# Altium schematic symbol library MCU_ST_STM32F4.SchLib: 211 symbols (part 4 of 10)
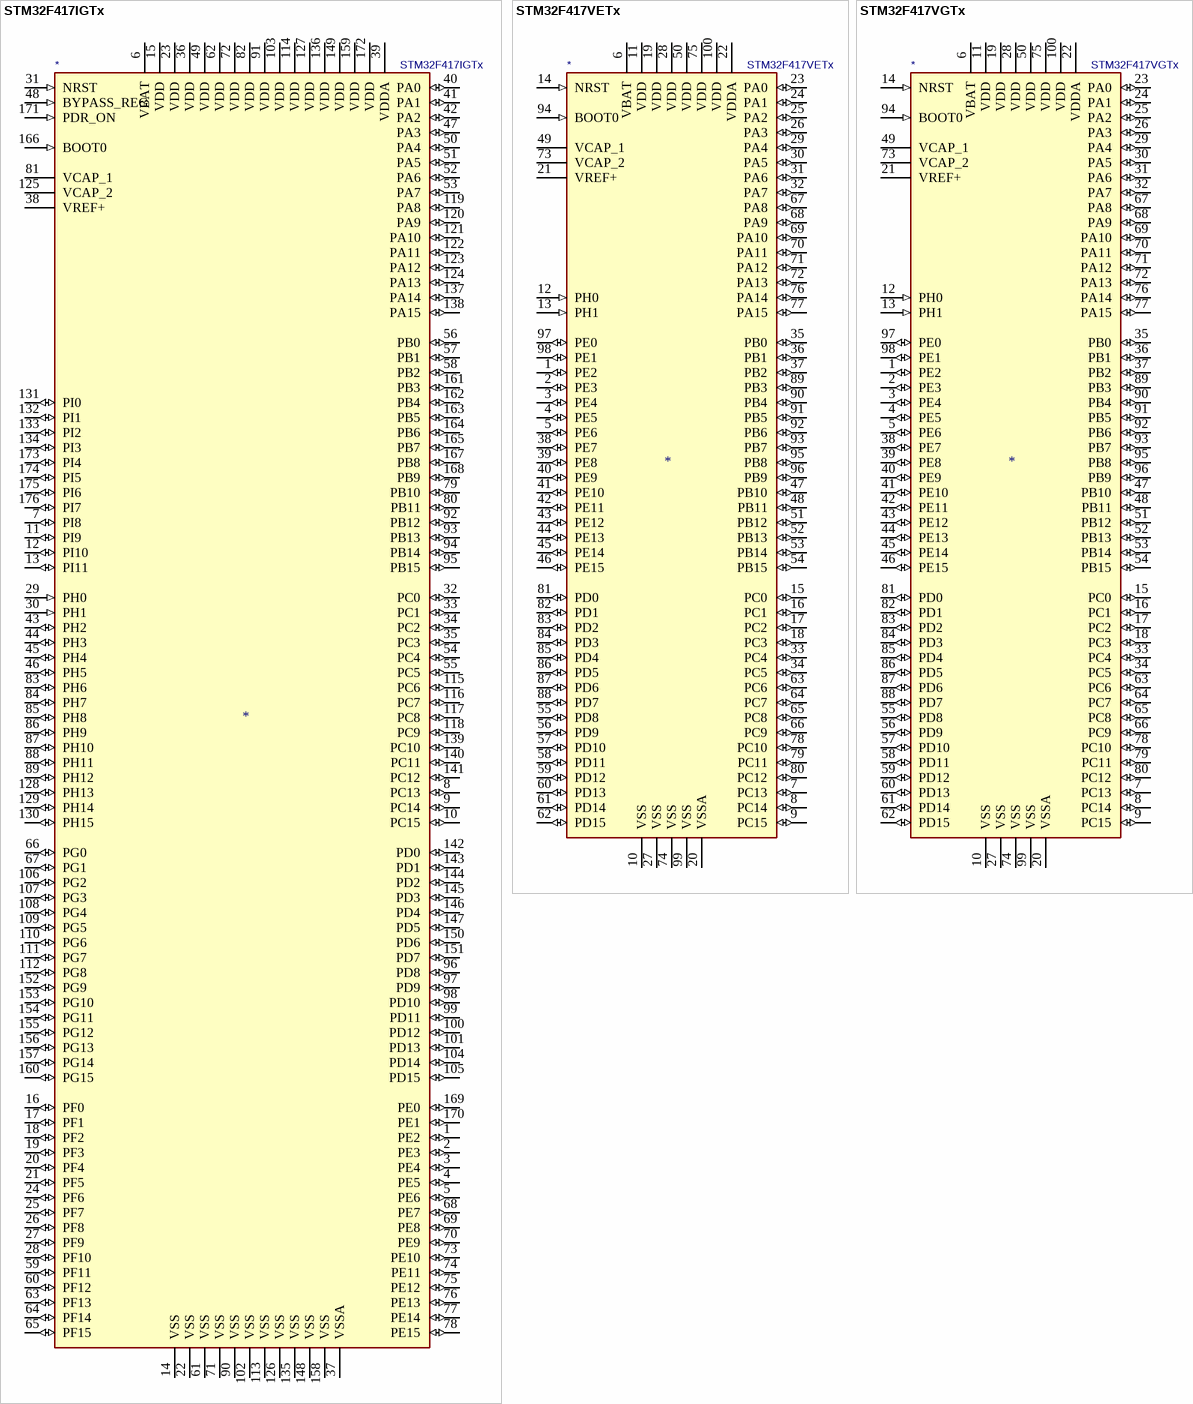
[diagram p65: symbols STM32F417IGTx to STM32F417VGTx]

## STM32F417VGTx
designator *  value STM32F417VGTx
ki_keywords: ARM Cortex-M4 STM32F4 STM32F407/417; ki_description: ARM Cortex-M4 MCU, 1024KB flash, 128KB RAM, 168MHz, 1.8-3.6V, 82 GPIO, LQFP-100; ki_fp_filters: LQFP*14x14mm*P0.5mm*; Footprint: Package_QFP:LQFP-100_14x14mm_P0.5mm; Supplier: http://www.st.com/st-web-ui/static/active/en/resource/technical/document/datasheet/DM00035129.pdf
footprint LQFP-100_14x14mm_P0.5mm
pins: 1 PE2 (io), 2 PE3 (io), 3 PE4 (io), 4 PE5 (io), 5 PE6 (io), 6 VBAT (power), 7 PC13 (io), 8 PC14 (io), 9 PC15 (io), 10 VSS (power), 11 VDD (power), 12 PH0 (in), 13 PH1 (in), 14 NRST (in), 15 PC0 (io), 16 PC1 (io), 17 PC2 (io), 18 PC3 (io), 19 VDD (power), 20 VSSA (power), 21 VREF+ (power), 22 VDDA (power), 23 PA0 (io), 24 PA1 (io), 25 PA2 (io), 26 PA3 (io), 27 VSS (power), 28 VDD (power), 29 PA4 (io), 30 PA5 (io), 31 PA6 (io), 32 PA7 (io), 33 PC4 (io), 34 PC5 (io), 35 PB0 (io), 36 PB1 (io), 37 PB2 (io), 38 PE7 (io), 39 PE8 (io), 40 PE9 (io), 41 PE10 (io), 42 PE11 (io), 43 PE12 (io), 44 PE13 (io), 45 PE14 (io), 46 PE15 (io), 47 PB10 (io), 48 PB11 (io), 49 VCAP_1 (power), 50 VDD (power), 51 PB12 (io), 52 PB13 (io), 53 PB14 (io), 54 PB15 (io), 55 PD8 (io), 56 PD9 (io), 57 PD10 (io), 58 PD11 (io), 59 PD12 (io), 60 PD13 (io), 61 PD14 (io), 62 PD15 (io), 63 PC6 (io), 64 PC7 (io), 65 PC8 (io), 66 PC9 (io), 67 PA8 (io), 68 PA9 (io), 69 PA10 (io), 70 PA11 (io), 71 PA12 (io), 72 PA13 (io), 73 VCAP_2 (power), 74 VSS (power), 75 VDD (power), 76 PA14 (io), 77 PA15 (io), 78 PC10 (io), 79 PC11 (io), 80 PC12 (io), 81 PD0 (io), 82 PD1 (io), 83 PD2 (io), 84 PD3 (io), 85 PD4 (io), 86 PD5 (io), 87 PD6 (io), 88 PD7 (io), 89 PB3 (io), 90 PB4 (io), 91 PB5 (io), 92 PB6 (io), 93 PB7 (io), 94 BOOT0 (in), 95 PB8 (io), 96 PB9 (io), 97 PE0 (io), 98 PE1 (io), 99 VSS (power), 100 VDD (power)

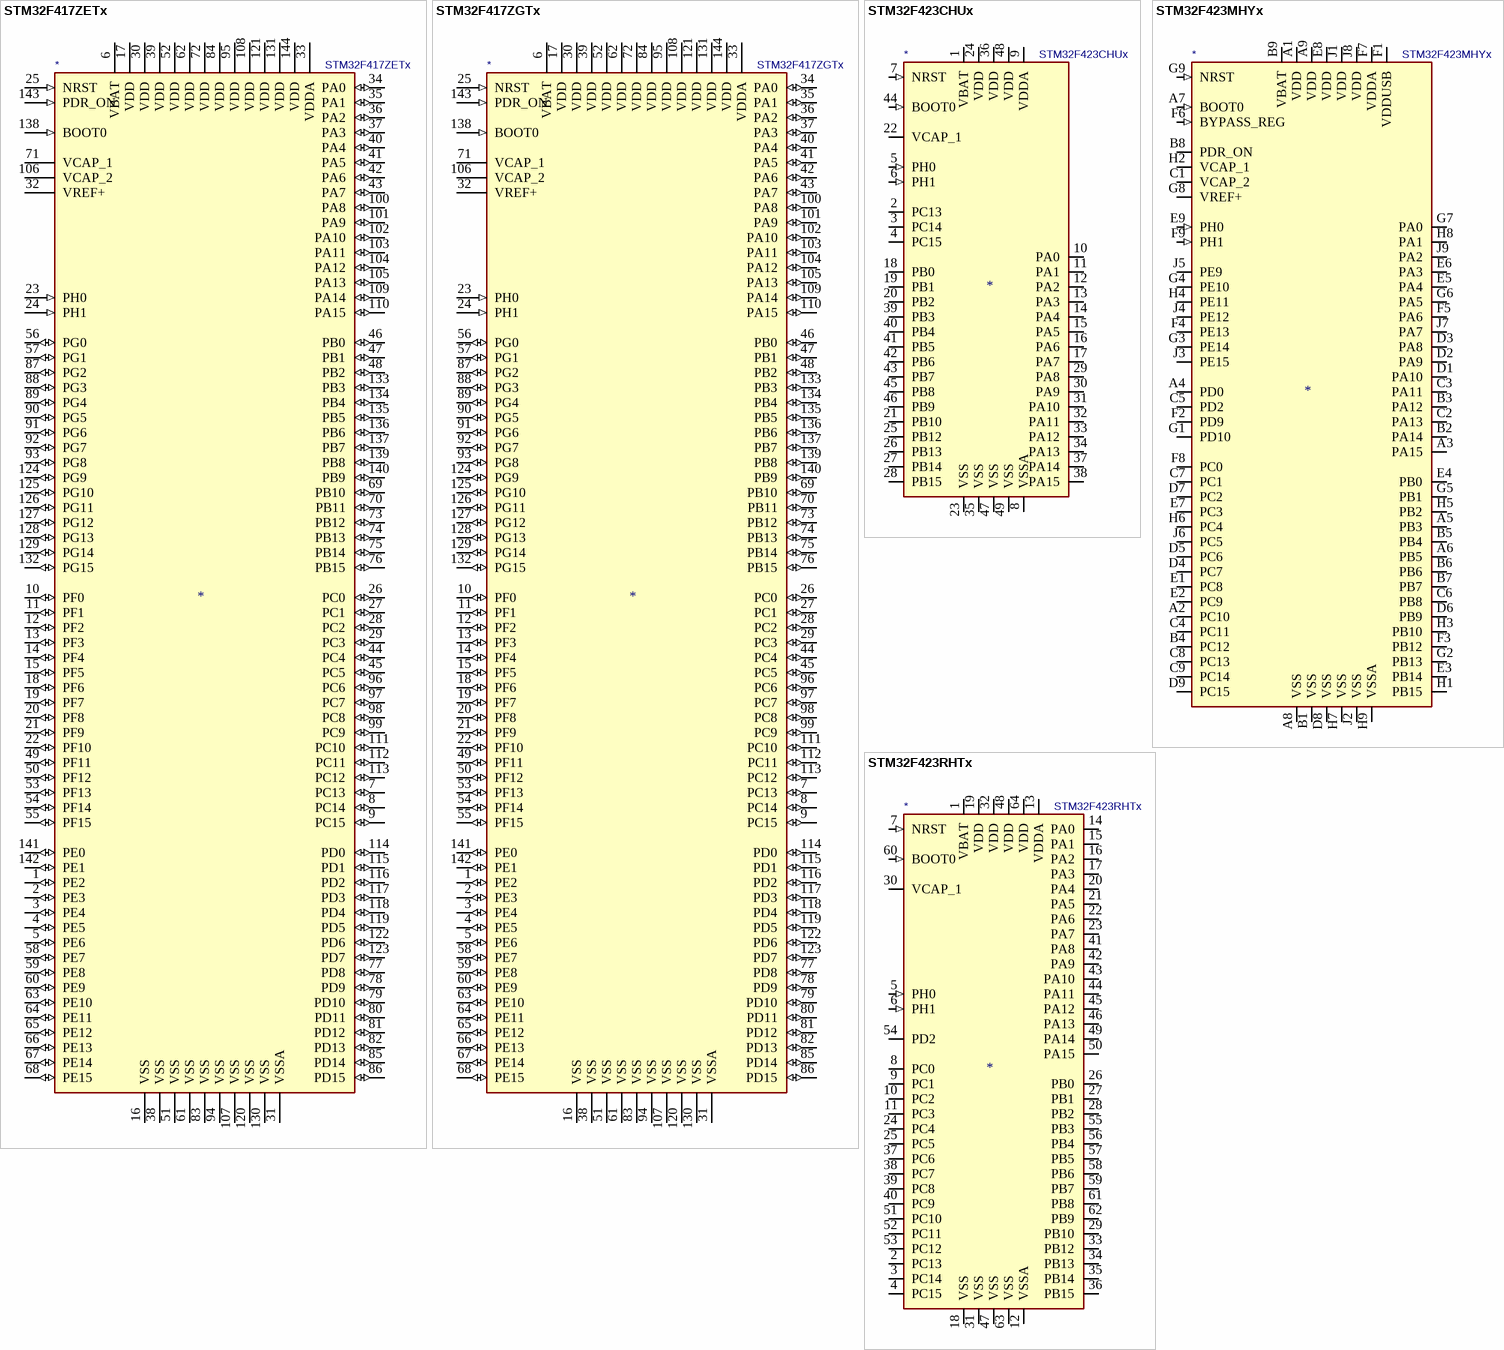
[diagram p20: symbols STM32F417ZETx to STM32F423RHTx]

## STM32F417ZETx
designator *  value STM32F417ZETx
ki_keywords: ARM Cortex-M4 STM32F4 STM32F407/417; ki_description: ARM Cortex-M4 MCU, 512KB flash, 128KB RAM, 168MHz, 1.8-3.6V, 114 GPIO, LQFP-144; ki_fp_filters: LQFP*20x20mm*P0.5mm*; Footprint: Package_QFP:LQFP-144_20x20mm_P0.5mm; Supplier: http://www.st.com/st-web-ui/static/active/en/resource/technical/document/datasheet/DM00035129.pdf
footprint LQFP-144_20x20mm_P0.5mm
pins: 1 PE2 (io), 2 PE3 (io), 3 PE4 (io), 4 PE5 (io), 5 PE6 (io), 6 VBAT (power), 7 PC13 (io), 8 PC14 (io), 9 PC15 (io), 10 PF0 (io), 11 PF1 (io), 12 PF2 (io), 13 PF3 (io), 14 PF4 (io), 15 PF5 (io), 16 VSS (power), 17 VDD (power), 18 PF6 (io), 19 PF7 (io), 20 PF8 (io), 21 PF9 (io), 22 PF10 (io), 23 PH0 (in), 24 PH1 (in), 25 NRST (in), 26 PC0 (io), 27 PC1 (io), 28 PC2 (io), 29 PC3 (io), 30 VDD (power), 31 VSSA (power), 32 VREF+ (power), 33 VDDA (power), 34 PA0 (io), 35 PA1 (io), 36 PA2 (io), 37 PA3 (io), 38 VSS (power), 39 VDD (power), 40 PA4 (io), 41 PA5 (io), 42 PA6 (io), 43 PA7 (io), 44 PC4 (io), 45 PC5 (io), 46 PB0 (io), 47 PB1 (io), 48 PB2 (io), 49 PF11 (io), 50 PF12 (io), 51 VSS (power), 52 VDD (power), 53 PF13 (io), 54 PF14 (io), 55 PF15 (io), 56 PG0 (io), 57 PG1 (io), 58 PE7 (io), 59 PE8 (io), 60 PE9 (io), 61 VSS (power), 62 VDD (power), 63 PE10 (io), 64 PE11 (io), 65 PE12 (io), 66 PE13 (io), 67 PE14 (io), 68 PE15 (io), 69 PB10 (io), 70 PB11 (io), 71 VCAP_1 (power), 72 VDD (power), 73 PB12 (io), 74 PB13 (io), 75 PB14 (io), 76 PB15 (io), 77 PD8 (io), 78 PD9 (io), 79 PD10 (io), 80 PD11 (io), 81 PD12 (io), 82 PD13 (io), 83 VSS (power), 84 VDD (power), 85 PD14 (io), 86 PD15 (io), 87 PG2 (io), 88 PG3 (io), 89 PG4 (io), 90 PG5 (io), 91 PG6 (io), 92 PG7 (io), 93 PG8 (io), 94 VSS (power), 95 VDD (power), 96 PC6 (io), 97 PC7 (io), 98 PC8 (io), 99 PC9 (io), 100 PA8 (io), 101 PA9 (io), 102 PA10 (io), 103 PA11 (io), 104 PA12 (io), 105 PA13 (io), 106 VCAP_2 (power), 107 VSS (power), 108 VDD (power), 109 PA14 (io), 110 PA15 (io), 111 PC10 (io), 112 PC11 (io), 113 PC12 (io), 114 PD0 (io), 115 PD1 (io), 116 PD2 (io), 117 PD3 (io), 118 PD4 (io), 119 PD5 (io), 120 VSS (power), 121 VDD (power), 122 PD6 (io), 123 PD7 (io), 124 PG9 (io), 125 PG10 (io), 126 PG11 (io), 127 PG12 (io), 128 PG13 (io), 129 PG14 (io), 130 VSS (power), 131 VDD (power), 132 PG15 (io), 133 PB3 (io), 134 PB4 (io), 135 PB5 (io), 136 PB6 (io), 137 PB7 (io), 138 BOOT0 (in), 139 PB8 (io), 140 PB9 (io), 141 PE0 (io), 142 PE1 (io), 143 PDR_ON (in), 144 VDD (power)

## STM32F417ZGTx
designator *  value STM32F417ZGTx
ki_keywords: ARM Cortex-M4 STM32F4 STM32F407/417; ki_description: ARM Cortex-M4 MCU, 1024KB flash, 128KB RAM, 168MHz, 1.8-3.6V, 114 GPIO, LQFP-144; ki_fp_filters: LQFP*20x20mm*P0.5mm*; Footprint: Package_QFP:LQFP-144_20x20mm_P0.5mm; Supplier: http://www.st.com/st-web-ui/static/active/en/resource/technical/document/datasheet/DM00035129.pdf
footprint LQFP-144_20x20mm_P0.5mm
pins: 1 PE2 (io), 2 PE3 (io), 3 PE4 (io), 4 PE5 (io), 5 PE6 (io), 6 VBAT (power), 7 PC13 (io), 8 PC14 (io), 9 PC15 (io), 10 PF0 (io), 11 PF1 (io), 12 PF2 (io), 13 PF3 (io), 14 PF4 (io), 15 PF5 (io), 16 VSS (power), 17 VDD (power), 18 PF6 (io), 19 PF7 (io), 20 PF8 (io), 21 PF9 (io), 22 PF10 (io), 23 PH0 (in), 24 PH1 (in), 25 NRST (in), 26 PC0 (io), 27 PC1 (io), 28 PC2 (io), 29 PC3 (io), 30 VDD (power), 31 VSSA (power), 32 VREF+ (power), 33 VDDA (power), 34 PA0 (io), 35 PA1 (io), 36 PA2 (io), 37 PA3 (io), 38 VSS (power), 39 VDD (power), 40 PA4 (io), 41 PA5 (io), 42 PA6 (io), 43 PA7 (io), 44 PC4 (io), 45 PC5 (io), 46 PB0 (io), 47 PB1 (io), 48 PB2 (io), 49 PF11 (io), 50 PF12 (io), 51 VSS (power), 52 VDD (power), 53 PF13 (io), 54 PF14 (io), 55 PF15 (io), 56 PG0 (io), 57 PG1 (io), 58 PE7 (io), 59 PE8 (io), 60 PE9 (io), 61 VSS (power), 62 VDD (power), 63 PE10 (io), 64 PE11 (io), 65 PE12 (io), 66 PE13 (io), 67 PE14 (io), 68 PE15 (io), 69 PB10 (io), 70 PB11 (io), 71 VCAP_1 (power), 72 VDD (power), 73 PB12 (io), 74 PB13 (io), 75 PB14 (io), 76 PB15 (io), 77 PD8 (io), 78 PD9 (io), 79 PD10 (io), 80 PD11 (io), 81 PD12 (io), 82 PD13 (io), 83 VSS (power), 84 VDD (power), 85 PD14 (io), 86 PD15 (io), 87 PG2 (io), 88 PG3 (io), 89 PG4 (io), 90 PG5 (io), 91 PG6 (io), 92 PG7 (io), 93 PG8 (io), 94 VSS (power), 95 VDD (power), 96 PC6 (io), 97 PC7 (io), 98 PC8 (io), 99 PC9 (io), 100 PA8 (io), 101 PA9 (io), 102 PA10 (io), 103 PA11 (io), 104 PA12 (io), 105 PA13 (io), 106 VCAP_2 (power), 107 VSS (power), 108 VDD (power), 109 PA14 (io), 110 PA15 (io), 111 PC10 (io), 112 PC11 (io), 113 PC12 (io), 114 PD0 (io), 115 PD1 (io), 116 PD2 (io), 117 PD3 (io), 118 PD4 (io), 119 PD5 (io), 120 VSS (power), 121 VDD (power), 122 PD6 (io), 123 PD7 (io), 124 PG9 (io), 125 PG10 (io), 126 PG11 (io), 127 PG12 (io), 128 PG13 (io), 129 PG14 (io), 130 VSS (power), 131 VDD (power), 132 PG15 (io), 133 PB3 (io), 134 PB4 (io), 135 PB5 (io), 136 PB6 (io), 137 PB7 (io), 138 BOOT0 (in), 139 PB8 (io), 140 PB9 (io), 141 PE0 (io), 142 PE1 (io), 143 PDR_ON (in), 144 VDD (power)

## STM32F423CHUx
designator *  value STM32F423CHUx
ki_keywords: ARM Cortex-M4 STM32F4 STM32F413/423; ki_description: ARM Cortex-M4 MCU, 1536KB flash, 320KB RAM, 100MHz, 1.7-3.6V, 36 GPIO, UFQFPN-48; ki_fp_filters: QFN*1EP*7x7mm*P0.5mm*; Footprint: Package_DFN_QFN:QFN-48-1EP_7x7mm_P0.5mm_EP5.6x5.6mm; Supplier: http://www.st.com/st-web-ui/static/active/en/resource/technical/document/datasheet/DM00282247.pdf
footprint QFN-48-1EP_7x7mm_P0.5mm_EP5.6x5.6mm
pins: 1 VBAT (power), 2 PC13 (io), 3 PC14 (io), 4 PC15 (io), 5 PH0 (in), 6 PH1 (in), 7 NRST (in), 8 VSSA (power), 9 VDDA (power), 10 PA0 (io), 11 PA1 (io), 12 PA2 (io), 13 PA3 (io), 14 PA4 (io), 15 PA5 (io), 16 PA6 (io), 17 PA7 (io), 18 PB0 (io), 19 PB1 (io), 20 PB2 (io), 21 PB10 (io), 22 VCAP_1 (power), 23 VSS (power), 24 VDD (power), 25 PB12 (io), 26 PB13 (io), 27 PB14 (io), 28 PB15 (io), 29 PA8 (io), 30 PA9 (io), 31 PA10 (io), 32 PA11 (io), 33 PA12 (io), 34 PA13 (io), 35 VSS (power), 36 VDD (power), 37 PA14 (io), 38 PA15 (io), 39 PB3 (io), 40 PB4 (io), 41 PB5 (io), 42 PB6 (io), 43 PB7 (io), 44 BOOT0 (in), 45 PB8 (io), 46 PB9 (io), 47 VSS (power), 48 VDD (power), 49 VSS (power)

## STM32F423MHYx
designator *  value STM32F423MHYx
ki_keywords: ARM Cortex-M4 STM32F4 STM32F413/423; ki_description: ARM Cortex-M4 MCU, 1536KB flash, 320KB RAM, 100MHz, 1.7-3.6V, 60 GPIO, WLCSP-81; ki_fp_filters: ST_WLCSP*Die463*; Footprint: Package_CSP:ST_WLCSP-81_Die463; Supplier: http://www.st.com/st-web-ui/static/active/en/resource/technical/document/datasheet/DM00282247.pdf
footprint ST_WLCSP-81_Die463
pins: A1 VDD (power), A2 PC10 (io), A3 PA15 (io), A4 PD0 (io), A5 PB3 (io), A6 PB5 (io), A7 BOOT0 (in), A8 VSS (power), A9 VDD (power), B1 VSS (power), B2 PA14 (io), B3 PA12 (io), B4 PC12 (io), B5 PB4 (io), B6 PB6 (io), B7 PB7 (io), B8 PDR_ON (power), B9 VBAT (power), C1 VCAP_2 (power), C2 PA13 (io), C3 PA11 (io), C4 PC11 (io), C5 PD2 (io), C6 PB8 (io), C7 PC1 (io), C8 PC13 (io), C9 PC14 (io), D1 PA10 (io), D2 PA9 (io), D3 PA8 (io), D4 PC7 (io), D5 PC6 (io), D6 PB9 (io), D7 PC2 (io), D8 VSS (power), D9 PC15 (io), E1 PC8 (io), E2 PC9 (io), E3 PB14 (io), E4 PB0 (io), E5 PA4 (io), E6 PA3 (io), E7 PC3 (io), E8 VDD (power), E9 PH0 (in), F1 VDDUSB (power), F2 PD9 (io), F3 PB12 (io), F4 PE13 (io), F5 PA6 (io), F6 BYPASS_REG (in), F7 VDDA (power), F8 PC0 (io), F9 PH1 (in), G1 PD10 (io), G2 PB13 (io), G3 PE14 (io), G4 PE10 (io), G5 PB1 (io), G6 PA5 (io), G7 PA0 (io), G8 VREF+ (power), G9 NRST (in), H1 PB15 (io), H2 VCAP_1 (power), H3 PB10 (io), H4 PE11 (io), H5 PB2 (io), H6 PC4 (io), H7 VSS (power), H8 PA1 (io), H9 VSSA (power), J1 VDD (power), J2 VSS (power), J3 PE15 (io), J4 PE12 (io), J5 PE9 (io), J6 PC5 (io), J7 PA7 (io), J8 VDD (power), J9 PA2 (io)

## STM32F423RHTx
designator *  value STM32F423RHTx
ki_keywords: ARM Cortex-M4 STM32F4 STM32F413/423; ki_description: ARM Cortex-M4 MCU, 1536KB flash, 320KB RAM, 100MHz, 1.7-3.6V, 50 GPIO, LQFP-64; ki_fp_filters: LQFP*10x10mm*P0.5mm*; Footprint: Package_QFP:LQFP-64_10x10mm_P0.5mm; Supplier: http://www.st.com/st-web-ui/static/active/en/resource/technical/document/datasheet/DM00282247.pdf
footprint LQFP-64_10x10mm_P0.5mm
pins: 1 VBAT (power), 2 PC13 (io), 3 PC14 (io), 4 PC15 (io), 5 PH0 (in), 6 PH1 (in), 7 NRST (in), 8 PC0 (io), 9 PC1 (io), 10 PC2 (io), 11 PC3 (io), 12 VSSA (power), 13 VDDA (power), 14 PA0 (io), 15 PA1 (io), 16 PA2 (io), 17 PA3 (io), 18 VSS (power), 19 VDD (power), 20 PA4 (io), 21 PA5 (io), 22 PA6 (io), 23 PA7 (io), 24 PC4 (io), 25 PC5 (io), 26 PB0 (io), 27 PB1 (io), 28 PB2 (io), 29 PB10 (io), 30 VCAP_1 (power), 31 VSS (power), 32 VDD (power), 33 PB12 (io), 34 PB13 (io), 35 PB14 (io), 36 PB15 (io), 37 PC6 (io), 38 PC7 (io), 39 PC8 (io), 40 PC9 (io), 41 PA8 (io), 42 PA9 (io), 43 PA10 (io), 44 PA11 (io), 45 PA12 (io), 46 PA13 (io), 47 VSS (power), 48 VDD (power), 49 PA14 (io), 50 PA15 (io), 51 PC10 (io), 52 PC11 (io), 53 PC12 (io), 54 PD2 (io), 55 PB3 (io), 56 PB4 (io), 57 PB5 (io), 58 PB6 (io), 59 PB7 (io), 60 BOOT0 (in), 61 PB8 (io), 62 PB9 (io), 63 VSS (power), 64 VDD (power)

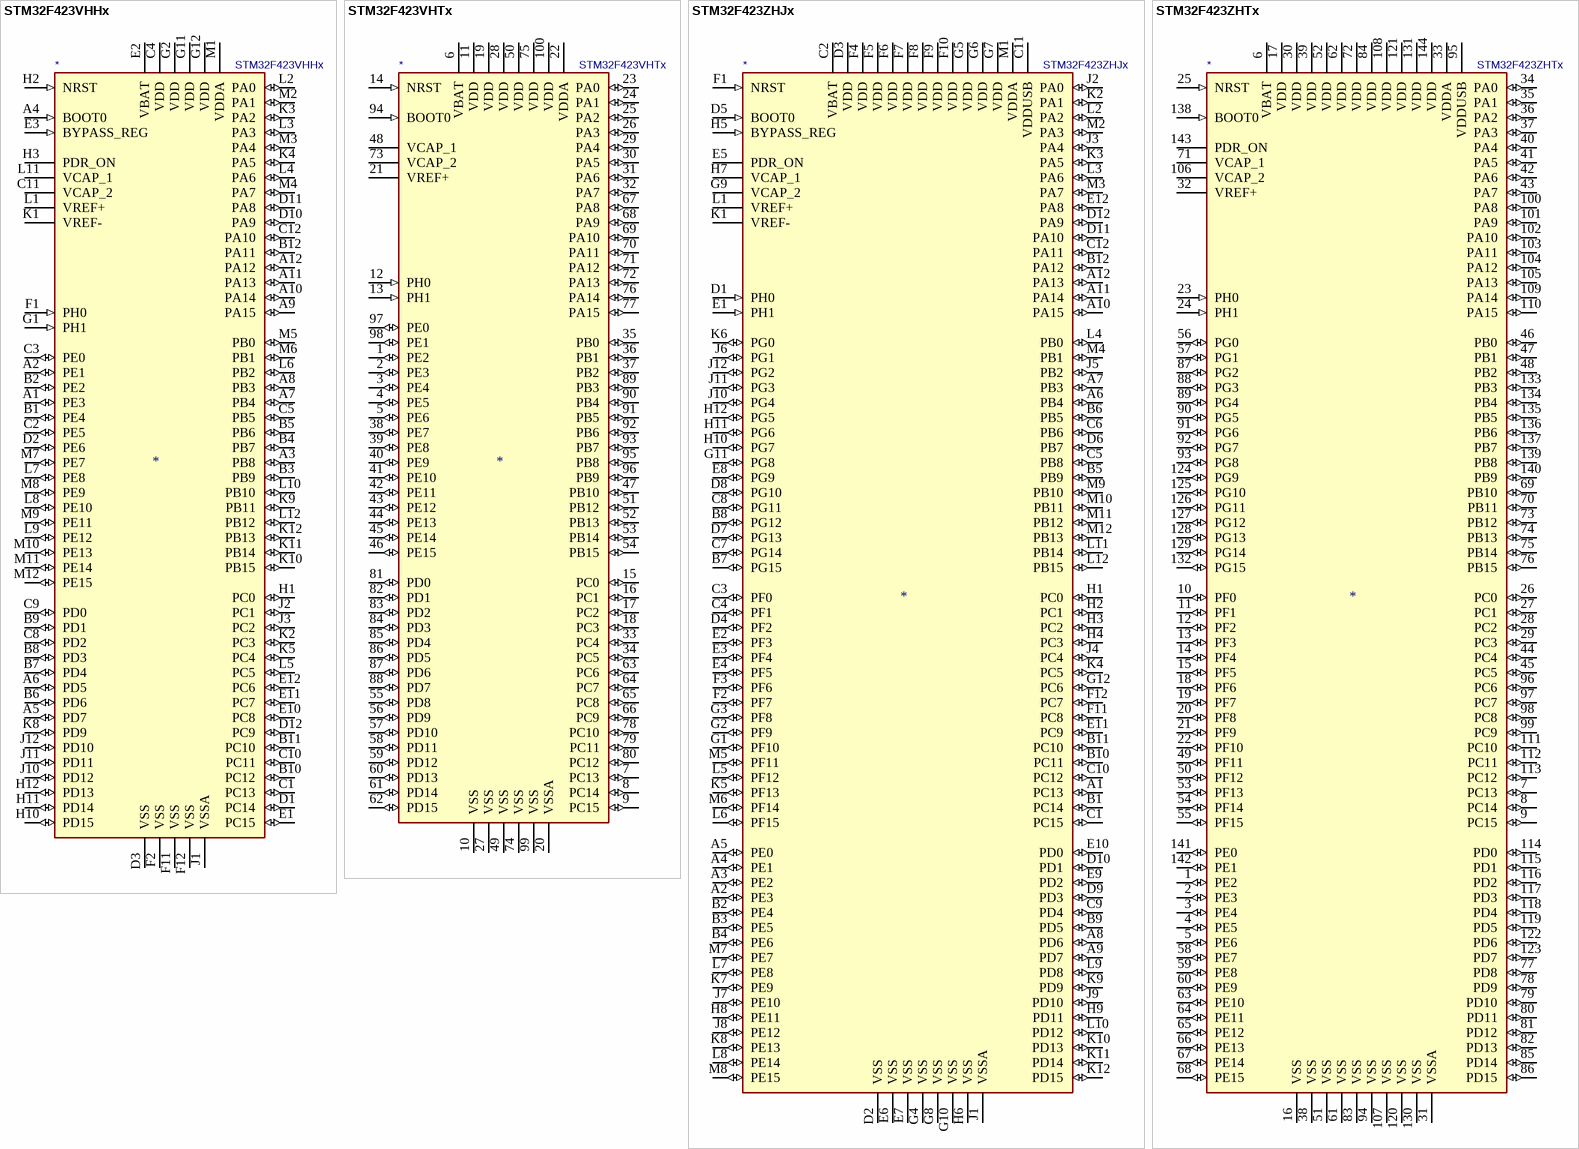
[diagram p21: symbols STM32F423VHHx to STM32F423ZHTx]

## STM32F423VHHx
designator *  value STM32F423VHHx
ki_keywords: ARM Cortex-M4 STM32F4 STM32F413/423; ki_description: ARM Cortex-M4 MCU, 1536KB flash, 320KB RAM, 100MHz, 1.7-3.6V, 81 GPIO, UFBGA-100; ki_fp_filters: UFBGA*7x7mm*Layout12x12*P0.5mm*; Footprint: Package_BGA:UFBGA-100_7x7mm_Layout12x12_P0.5mm; Supplier: http://www.st.com/st-web-ui/static/active/en/resource/technical/document/datasheet/DM00282247.pdf
footprint UFBGA-100_7x7mm_Layout12x12_P0.5mm
pins: A1 PE3 (io), A2 PE1 (io), A3 PB8 (io), A4 BOOT0 (in), A5 PD7 (io), A6 PD5 (io), A7 PB4 (io), A8 PB3 (io), A9 PA15 (io), A10 PA14 (io), A11 PA13 (io), A12 PA12 (io), B1 PE4 (io), B2 PE2 (io), B3 PB9 (io), B4 PB7 (io), B5 PB6 (io), B6 PD6 (io), B7 PD4 (io), B8 PD3 (io), B9 PD1 (io), B10 PC12 (io), B11 PC10 (io), B12 PA11 (io), C1 PC13 (io), C2 PE5 (io), C3 PE0 (io), C4 VDD (power), C5 PB5 (io), C8 PD2 (io), C9 PD0 (io), C10 PC11 (io), C11 VCAP_2 (power), C12 PA10 (io), D1 PC14 (io), D2 PE6 (io), D3 VSS (power), D10 PA9 (io), D11 PA8 (io), D12 PC9 (io), E1 PC15 (io), E2 VBAT (power), E3 BYPASS_REG (in), E10 PC8 (io), E11 PC7 (io), E12 PC6 (io), F1 PH0 (in), F2 VSS (power), F11 VSS (power), F12 VSS (power), G1 PH1 (in), G2 VDD (power), G11 VDD (power), G12 VDD (power), H1 PC0 (io), H2 NRST (in), H3 PDR_ON (power), H10 PD15 (io), H11 PD14 (io), H12 PD13 (io), J1 VSSA (power), J2 PC1 (io), J3 PC2 (io), J10 PD12 (io), J11 PD11 (io), J12 PD10 (io), K1 VREF- (power), K2 PC3 (io), K3 PA2 (io), K4 PA5 (io), K5 PC4 (io), K8 PD9 (io), K9 PB11 (io), K10 PB15 (io), K11 PB14 (io), K12 PB13 (io), L1 VREF+ (power), L2 PA0 (io), L3 PA3 (io), L4 PA6 (io), L5 PC5 (io), L6 PB2 (io), L7 PE8 (io), L8 PE10 (io), L9 PE12 (io), L10 PB10 (io), L11 VCAP_1 (power), L12 PB12 (io), M1 VDDA (power), M2 PA1 (io), M3 PA4 (io), M4 PA7 (io), M5 PB0 (io), M6 PB1 (io), M7 PE7 (io), M8 PE9 (io), M9 PE11 (io), M10 PE13 (io), M11 PE14 (io), M12 PE15 (io)

## STM32F423VHTx
designator *  value STM32F423VHTx
ki_keywords: ARM Cortex-M4 STM32F4 STM32F413/423; ki_description: ARM Cortex-M4 MCU, 1536KB flash, 320KB RAM, 100MHz, 1.7-3.6V, 81 GPIO, LQFP-100; ki_fp_filters: LQFP*14x14mm*P0.5mm*; Footprint: Package_QFP:LQFP-100_14x14mm_P0.5mm; Supplier: http://www.st.com/st-web-ui/static/active/en/resource/technical/document/datasheet/DM00282247.pdf
footprint LQFP-100_14x14mm_P0.5mm
pins: 1 PE2 (io), 2 PE3 (io), 3 PE4 (io), 4 PE5 (io), 5 PE6 (io), 6 VBAT (power), 7 PC13 (io), 8 PC14 (io), 9 PC15 (io), 10 VSS (power), 11 VDD (power), 12 PH0 (in), 13 PH1 (in), 14 NRST (in), 15 PC0 (io), 16 PC1 (io), 17 PC2 (io), 18 PC3 (io), 19 VDD (power), 20 VSSA (power), 21 VREF+ (power), 22 VDDA (power), 23 PA0 (io), 24 PA1 (io), 25 PA2 (io), 26 PA3 (io), 27 VSS (power), 28 VDD (power), 29 PA4 (io), 30 PA5 (io), 31 PA6 (io), 32 PA7 (io), 33 PC4 (io), 34 PC5 (io), 35 PB0 (io), 36 PB1 (io), 37 PB2 (io), 38 PE7 (io), 39 PE8 (io), 40 PE9 (io), 41 PE10 (io), 42 PE11 (io), 43 PE12 (io), 44 PE13 (io), 45 PE14 (io), 46 PE15 (io), 47 PB10 (io), 48 VCAP_1 (power), 49 VSS (power), 50 VDD (power), 51 PB12 (io), 52 PB13 (io), 53 PB14 (io), 54 PB15 (io), 55 PD8 (io), 56 PD9 (io), 57 PD10 (io), 58 PD11 (io), 59 PD12 (io), 60 PD13 (io), 61 PD14 (io), 62 PD15 (io), 63 PC6 (io), 64 PC7 (io), 65 PC8 (io), 66 PC9 (io), 67 PA8 (io), 68 PA9 (io), 69 PA10 (io), 70 PA11 (io), 71 PA12 (io), 72 PA13 (io), 73 VCAP_2 (power), 74 VSS (power), 75 VDD (power), 76 PA14 (io), 77 PA15 (io), 78 PC10 (io), 79 PC11 (io), 80 PC12 (io), 81 PD0 (io), 82 PD1 (io), 83 PD2 (io), 84 PD3 (io), 85 PD4 (io), 86 PD5 (io), 87 PD6 (io), 88 PD7 (io), 89 PB3 (io), 90 PB4 (io), 91 PB5 (io), 92 PB6 (io), 93 PB7 (io), 94 BOOT0 (in), 95 PB8 (io), 96 PB9 (io), 97 PE0 (io), 98 PE1 (io), 99 VSS (power), 100 VDD (power)

## STM32F423ZHJx
designator *  value STM32F423ZHJx
ki_keywords: ARM Cortex-M4 STM32F4 STM32F413/423; ki_description: ARM Cortex-M4 MCU, 1536KB flash, 320KB RAM, 100MHz, 1.7-3.6V, 114 GPIO, UFBGA-144; ki_fp_filters: UFBGA*10x10mm*Layout12x12*P0.8mm*; Footprint: Package_BGA:UFBGA-144_10x10mm_Layout12x12_P0.8mm; Supplier: http://www.st.com/st-web-ui/static/active/en/resource/technical/document/datasheet/DM00282247.pdf
footprint UFBGA-144_10x10mm_Layout12x12_P0.8mm
pins: A1 PC13 (io), A2 PE3 (io), A3 PE2 (io), A4 PE1 (io), A5 PE0 (io), A6 PB4 (io), A7 PB3 (io), A8 PD6 (io), A9 PD7 (io), A10 PA15 (io), A11 PA14 (io), A12 PA13 (io), B1 PC14 (io), B2 PE4 (io), B3 PE5 (io), B4 PE6 (io), B5 PB9 (io), B6 PB5 (io), B7 PG15 (io), B8 PG12 (io), B9 PD5 (io), B10 PC11 (io), B11 PC10 (io), B12 PA12 (io), C1 PC15 (io), C2 VBAT (power), C3 PF0 (io), C4 PF1 (io), C5 PB8 (io), C6 PB6 (io), C7 PG14 (io), C8 PG11 (io), C9 PD4 (io), C10 PC12 (io), C11 VDDUSB (power), C12 PA11 (io), D1 PH0 (in), D2 VSS (power), D3 VDD (power), D4 PF2 (io), D5 BOOT0 (in), D6 PB7 (io), D7 PG13 (io), D8 PG10 (io), D9 PD3 (io), D10 PD1 (io), D11 PA10 (io), D12 PA9 (io), E1 PH1 (in), E2 PF3 (io), E3 PF4 (io), E4 PF5 (io), E5 PDR_ON (power), E6 VSS (power), E7 VSS (power), E8 PG9 (io), E9 PD2 (io), E10 PD0 (io), E11 PC9 (io), E12 PA8 (io), F1 NRST (in), F2 PF7 (io), F3 PF6 (io), F4 VDD (power), F5 VDD (power), F6 VDD (power), F7 VDD (power), F8 VDD (power), F9 VDD (power), F10 VDD (power), F11 PC8 (io), F12 PC7 (io), G1 PF10 (io), G2 PF9 (io), G3 PF8 (io), G4 VSS (power), G5 VDD (power), G6 VDD (power), G7 VDD (power), G8 VSS (power), G9 VCAP_2 (power), G10 VSS (power), G11 PG8 (io), G12 PC6 (io), H1 PC0 (io), H2 PC1 (io), H3 PC2 (io), H4 PC3 (io), H5 BYPASS_REG (in), H6 VSS (power), H7 VCAP_1 (power), H8 PE11 (io), H9 PD11 (io), H10 PG7 (io), H11 PG6 (io), H12 PG5 (io), J1 VSSA (power), J2 PA0 (io), J3 PA4 (io), J4 PC4 (io), J5 PB2 (io), J6 PG1 (io), J7 PE10 (io), J8 PE12 (io), J9 PD10 (io), J10 PG4 (io), J11 PG3 (io), J12 PG2 (io), K1 VREF- (power), K2 PA1 (io), K3 PA5 (io), K4 PC5 (io), K5 PF13 (io), K6 PG0 (io), K7 PE9 (io), K8 PE13 (io), K9 PD9 (io), K10 PD13 (io), K11 PD14 (io), K12 PD15 (io), L1 VREF+ (power), L2 PA2 (io), L3 PA6 (io), L4 PB0 (io), L5 PF12 (io), L6 PF15 (io), L7 PE8 (io), L8 PE14 (io), L9 PD8 (io), L10 PD12 (io), L11 PB14 (io), L12 PB15 (io), M1 VDDA (power), M2 PA3 (io), M3 PA7 (io), M4 PB1 (io), M5 PF11 (io), M6 PF14 (io), M7 PE7 (io), M8 PE15 (io), M9 PB10 (io), M10 PB11 (io), M11 PB12 (io), M12 PB13 (io)

## STM32F423ZHTx
designator *  value STM32F423ZHTx
ki_keywords: ARM Cortex-M4 STM32F4 STM32F413/423; ki_description: ARM Cortex-M4 MCU, 1536KB flash, 320KB RAM, 100MHz, 1.7-3.6V, 114 GPIO, LQFP-144; ki_fp_filters: LQFP*20x20mm*P0.5mm*; Footprint: Package_QFP:LQFP-144_20x20mm_P0.5mm; Supplier: http://www.st.com/st-web-ui/static/active/en/resource/technical/document/datasheet/DM00282247.pdf
footprint LQFP-144_20x20mm_P0.5mm
pins: 1 PE2 (io), 2 PE3 (io), 3 PE4 (io), 4 PE5 (io), 5 PE6 (io), 6 VBAT (power), 7 PC13 (io), 8 PC14 (io), 9 PC15 (io), 10 PF0 (io), 11 PF1 (io), 12 PF2 (io), 13 PF3 (io), 14 PF4 (io), 15 PF5 (io), 16 VSS (power), 17 VDD (power), 18 PF6 (io), 19 PF7 (io), 20 PF8 (io), 21 PF9 (io), 22 PF10 (io), 23 PH0 (in), 24 PH1 (in), 25 NRST (in), 26 PC0 (io), 27 PC1 (io), 28 PC2 (io), 29 PC3 (io), 30 VDD (power), 31 VSSA (power), 32 VREF+ (power), 33 VDDA (power), 34 PA0 (io), 35 PA1 (io), 36 PA2 (io), 37 PA3 (io), 38 VSS (power), 39 VDD (power), 40 PA4 (io), 41 PA5 (io), 42 PA6 (io), 43 PA7 (io), 44 PC4 (io), 45 PC5 (io), 46 PB0 (io), 47 PB1 (io), 48 PB2 (io), 49 PF11 (io), 50 PF12 (io), 51 VSS (power), 52 VDD (power), 53 PF13 (io), 54 PF14 (io), 55 PF15 (io), 56 PG0 (io), 57 PG1 (io), 58 PE7 (io), 59 PE8 (io), 60 PE9 (io), 61 VSS (power), 62 VDD (power), 63 PE10 (io), 64 PE11 (io), 65 PE12 (io), 66 PE13 (io), 67 PE14 (io), 68 PE15 (io), 69 PB10 (io), 70 PB11 (io), 71 VCAP_1 (power), 72 VDD (power), 73 PB12 (io), 74 PB13 (io), 75 PB14 (io), 76 PB15 (io), 77 PD8 (io), 78 PD9 (io), 79 PD10 (io), 80 PD11 (io), 81 PD12 (io), 82 PD13 (io), 83 VSS (power), 84 VDD (power), 85 PD14 (io), 86 PD15 (io), 87 PG2 (io), 88 PG3 (io), 89 PG4 (io), 90 PG5 (io), 91 PG6 (io), 92 PG7 (io), 93 PG8 (io), 94 VSS (power), 95 VDDUSB (power), 96 PC6 (io), 97 PC7 (io), 98 PC8 (io), 99 PC9 (io), 100 PA8 (io), 101 PA9 (io), 102 PA10 (io), 103 PA11 (io), 104 PA12 (io), 105 PA13 (io), 106 VCAP_2 (power), 107 VSS (power), 108 VDD (power), 109 PA14 (io), 110 PA15 (io), 111 PC10 (io), 112 PC11 (io), 113 PC12 (io), 114 PD0 (io), 115 PD1 (io), 116 PD2 (io), 117 PD3 (io), 118 PD4 (io), 119 PD5 (io), 120 VSS (power), 121 VDD (power), 122 PD6 (io), 123 PD7 (io), 124 PG9 (io), 125 PG10 (io), 126 PG11 (io), 127 PG12 (io), 128 PG13 (io), 129 PG14 (io), 130 VSS (power), 131 VDD (power), 132 PG15 (io), 133 PB3 (io), 134 PB4 (io), 135 PB5 (io), 136 PB6 (io), 137 PB7 (io), 138 BOOT0 (in), 139 PB8 (io), 140 PB9 (io), 141 PE0 (io), 142 PE1 (io), 143 PDR_ON (power), 144 VDD (power)

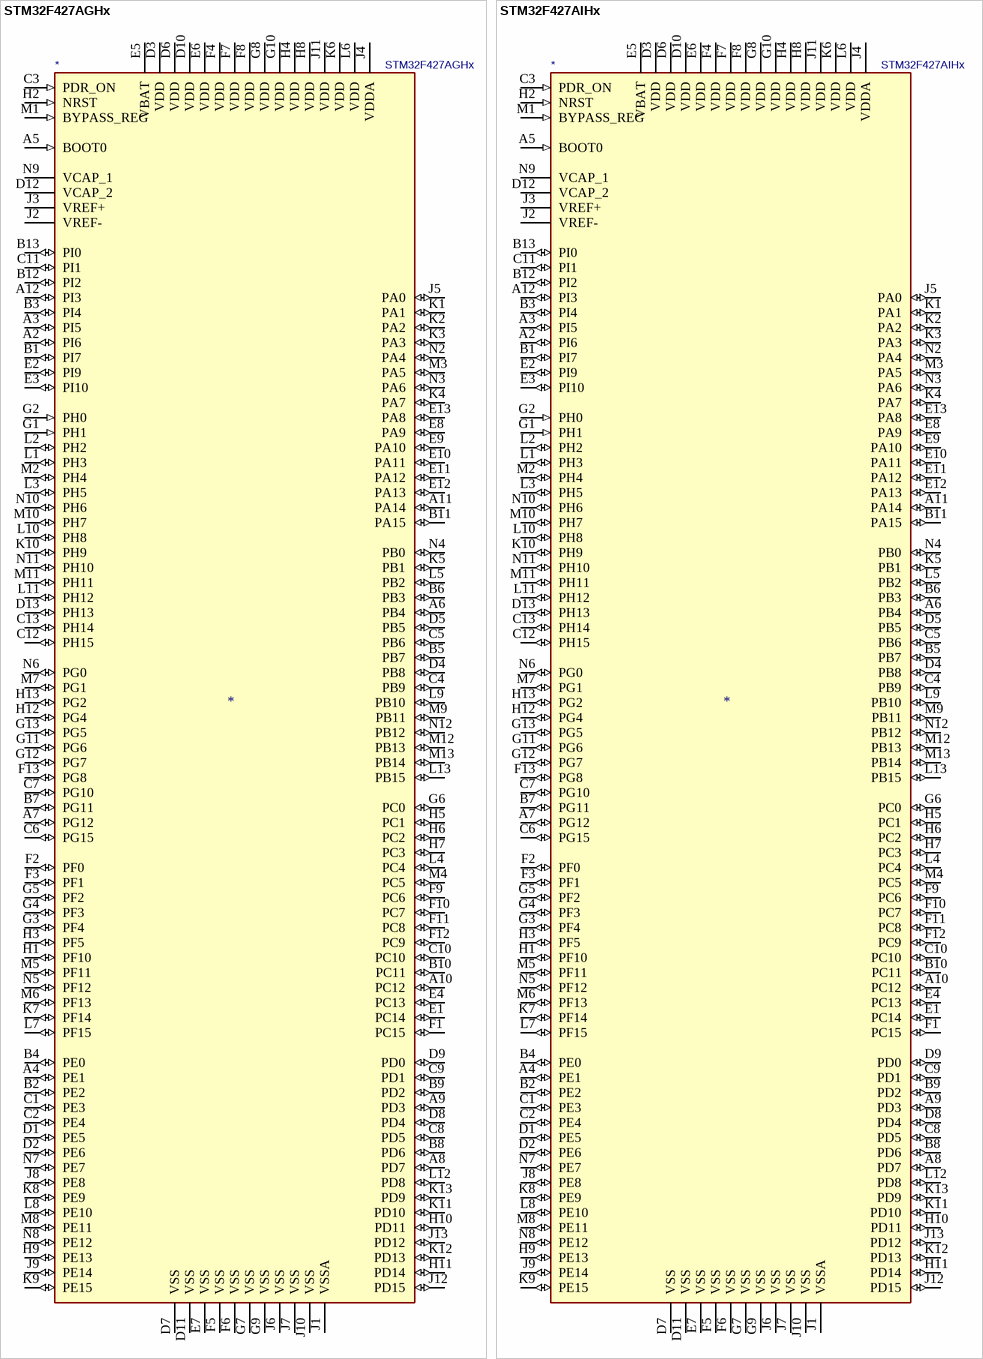
[diagram p22: symbols STM32F427AGHx to STM32F427AIHx]

## STM32F427AGHx
designator *  value STM32F427AGHx
ki_keywords: ARM Cortex-M4 STM32F4 STM32F427/437; ki_description: ARM Cortex-M4 MCU, 1024KB flash, 192KB RAM, 180MHz, 1.7-3.6V, 130 GPIO, UFBGA-169; ki_fp_filters: UFBGA*7x7mm*Layout13x13*P0.5mm*; Footprint: Package_BGA:UFBGA-169_7x7mm_Layout13x13_P0.5mm; Supplier: http://www.st.com/st-web-ui/static/active/en/resource/technical/document/datasheet/DM00071990.pdf
footprint UFBGA-169_7x7mm_Layout13x13_P0.5mm
pins: A1 NC (in) hidden, A2 PI6 (io), A3 PI5 (io), A4 PE1 (io), A5 BOOT0 (in), A6 PB4 (io), A7 PG12 (io), A8 PD7 (io), A9 PD3 (io), A10 PC12 (io), A11 PA14 (io), A12 PI3 (io), A13 NC (in) hidden, B1 PI7 (io), B2 PE2 (io), B3 PI4 (io), B4 PE0 (io), B5 PB7 (io), B6 PB3 (io), B7 PG11 (io), B8 PD6 (io), B9 PD2 (io), B10 PC11 (io), B11 PA15 (io), B12 PI2 (io), B13 PI0 (io), C1 PE3 (io), C2 PE4 (io), C3 PDR_ON (in), C4 PB9 (io), C5 PB6 (io), C6 PG15 (io), C7 PG10 (io), C8 PD5 (io), C9 PD1 (io), C10 PC10 (io), C11 PI1 (io), C12 PH15 (io), C13 PH14 (io), D1 PE5 (io), D2 PE6 (io), D3 VDD (power), D4 PB8 (io), D5 PB5 (io), D6 VDD (power), D7 VSS (power), D8 PD4 (io), D9 PD0 (io), D10 VDD (power), D11 VSS (power), D12 VCAP_2 (power), D13 PH13 (io), E1 PC14 (io), E2 PI9 (io), E3 PI10 (io), E4 PC13 (io), E5 VBAT (power), E6 VDD (power), E7 VSS (power), E8 PA9 (io), E9 PA10 (io), E10 PA11 (io), E11 PA12 (io), E12 PA13 (io), E13 PA8 (io), F1 PC15 (io), F2 PF0 (io), F3 PF1 (io), F4 VDD (power), F5 VSS (power), F6 VSS (power), F7 VDD (power), F8 VDD (power), F9 PC6 (io), F10 PC7 (io), F11 PC8 (io), F12 PC9 (io), F13 PG8 (io), G1 PH1 (in), G2 PH0 (in), G3 PF4 (io), G4 PF3 (io), G5 PF2 (io), G6 PC0 (io), G7 VSS (power), G8 VDD (power), G9 VSS (power), G10 VDD (power), G11 PG6 (io), G12 PG7 (io), G13 PG5 (io), H1 PF10 (io), H2 NRST (in), H3 PF5 (io), H4 VDD (power), H5 PC1 (io), H6 PC2 (io), H7 PC3 (io), H8 VDD (power), H9 PE13 (io), H10 PD11 (io), H11 PD14 (io), H12 PG4 (io), H13 PG2 (io), J1 VSSA (power), J2 VREF- (power), J3 VREF+ (power), J4 VDDA (power), J5 PA0 (io), J6 VSS (power), J7 VSS (power), J8 PE8 (io), J9 PE14 (io), J10 VSS (power), J11 VDD (power), J12 PD15 (io), J13 PD12 (io), K1 PA1 (io), K2 PA2 (io), K3 PA3 (io), K4 PA7 (io), K5 PB1 (io), K6 VDD (power), K7 PF14 (io), K8 PE9 (io), K9 PE15 (io), K10 PH9 (io), K11 PD10 (io), K12 PD13 (io), K13 PD9 (io), L1 PH3 (io), L2 PH2 (io), L3 PH5 (io), L4 PC4 (io), L5 PB2 (io), L6 VDD (power), L7 PF15 (io), L8 PE10 (io), L9 PB10 (io), L10 PH8 (io), L11 PH12 (io), L12 PD8 (io), L13 PB15 (io), M1 BYPASS_REG (in), M2 PH4 (io), M3 PA5 (io), M4 PC5 (io), M5 PF11 (io), M6 PF13 (io), M7 PG1 (io), M8 PE11 (io), M9 PB11 (io), M10 PH7 (io), M11 PH11 (io), M12 PB13 (io), M13 PB14 (io), N1 NC (in) hidden, N2 PA4 (io), N3 PA6 (io), N4 PB0 (io), N5 PF12 (io), N6 PG0 (io), N7 PE7 (io), N8 PE12 (io), N9 VCAP_1 (power), N10 PH6 (io), N11 PH10 (io), N12 PB12 (io), N13 NC (in) hidden

## STM32F427AIHx
designator *  value STM32F427AIHx
ki_keywords: ARM Cortex-M4 STM32F4 STM32F427/437; ki_description: ARM Cortex-M4 MCU, 2048KB flash, 192KB RAM, 180MHz, 1.7-3.6V, 130 GPIO, UFBGA-169; ki_fp_filters: UFBGA*7x7mm*Layout13x13*P0.5mm*; Footprint: Package_BGA:UFBGA-169_7x7mm_Layout13x13_P0.5mm; Supplier: http://www.st.com/st-web-ui/static/active/en/resource/technical/document/datasheet/DM00071990.pdf
footprint UFBGA-169_7x7mm_Layout13x13_P0.5mm
pins: A1 NC (in) hidden, A2 PI6 (io), A3 PI5 (io), A4 PE1 (io), A5 BOOT0 (in), A6 PB4 (io), A7 PG12 (io), A8 PD7 (io), A9 PD3 (io), A10 PC12 (io), A11 PA14 (io), A12 PI3 (io), A13 NC (in) hidden, B1 PI7 (io), B2 PE2 (io), B3 PI4 (io), B4 PE0 (io), B5 PB7 (io), B6 PB3 (io), B7 PG11 (io), B8 PD6 (io), B9 PD2 (io), B10 PC11 (io), B11 PA15 (io), B12 PI2 (io), B13 PI0 (io), C1 PE3 (io), C2 PE4 (io), C3 PDR_ON (in), C4 PB9 (io), C5 PB6 (io), C6 PG15 (io), C7 PG10 (io), C8 PD5 (io), C9 PD1 (io), C10 PC10 (io), C11 PI1 (io), C12 PH15 (io), C13 PH14 (io), D1 PE5 (io), D2 PE6 (io), D3 VDD (power), D4 PB8 (io), D5 PB5 (io), D6 VDD (power), D7 VSS (power), D8 PD4 (io), D9 PD0 (io), D10 VDD (power), D11 VSS (power), D12 VCAP_2 (power), D13 PH13 (io), E1 PC14 (io), E2 PI9 (io), E3 PI10 (io), E4 PC13 (io), E5 VBAT (power), E6 VDD (power), E7 VSS (power), E8 PA9 (io), E9 PA10 (io), E10 PA11 (io), E11 PA12 (io), E12 PA13 (io), E13 PA8 (io), F1 PC15 (io), F2 PF0 (io), F3 PF1 (io), F4 VDD (power), F5 VSS (power), F6 VSS (power), F7 VDD (power), F8 VDD (power), F9 PC6 (io), F10 PC7 (io), F11 PC8 (io), F12 PC9 (io), F13 PG8 (io), G1 PH1 (in), G2 PH0 (in), G3 PF4 (io), G4 PF3 (io), G5 PF2 (io), G6 PC0 (io), G7 VSS (power), G8 VDD (power), G9 VSS (power), G10 VDD (power), G11 PG6 (io), G12 PG7 (io), G13 PG5 (io), H1 PF10 (io), H2 NRST (in), H3 PF5 (io), H4 VDD (power), H5 PC1 (io), H6 PC2 (io), H7 PC3 (io), H8 VDD (power), H9 PE13 (io), H10 PD11 (io), H11 PD14 (io), H12 PG4 (io), H13 PG2 (io), J1 VSSA (power), J2 VREF- (power), J3 VREF+ (power), J4 VDDA (power), J5 PA0 (io), J6 VSS (power), J7 VSS (power), J8 PE8 (io), J9 PE14 (io), J10 VSS (power), J11 VDD (power), J12 PD15 (io), J13 PD12 (io), K1 PA1 (io), K2 PA2 (io), K3 PA3 (io), K4 PA7 (io), K5 PB1 (io), K6 VDD (power), K7 PF14 (io), K8 PE9 (io), K9 PE15 (io), K10 PH9 (io), K11 PD10 (io), K12 PD13 (io), K13 PD9 (io), L1 PH3 (io), L2 PH2 (io), L3 PH5 (io), L4 PC4 (io), L5 PB2 (io), L6 VDD (power), L7 PF15 (io), L8 PE10 (io), L9 PB10 (io), L10 PH8 (io), L11 PH12 (io), L12 PD8 (io), L13 PB15 (io), M1 BYPASS_REG (in), M2 PH4 (io), M3 PA5 (io), M4 PC5 (io), M5 PF11 (io), M6 PF13 (io), M7 PG1 (io), M8 PE11 (io), M9 PB11 (io), M10 PH7 (io), M11 PH11 (io), M12 PB13 (io), M13 PB14 (io), N1 NC (in) hidden, N2 PA4 (io), N3 PA6 (io), N4 PB0 (io), N5 PF12 (io), N6 PG0 (io), N7 PE7 (io), N8 PE12 (io), N9 VCAP_1 (power), N10 PH6 (io), N11 PH10 (io), N12 PB12 (io), N13 NC (in) hidden
